# Altium footprint library PCB库.PcbLib: 46 footprints (part 3 of 3)
Each footprint in its own frame and in the unit in brackets; x right, y up, seen from the top. Pads: shape width x height; smd on the part's side, far side on the other; paste and mask are expansions set on the pad; w line width, h text height; cw(c..) or ccw(c..) is an arc to the next point about the centre after c.
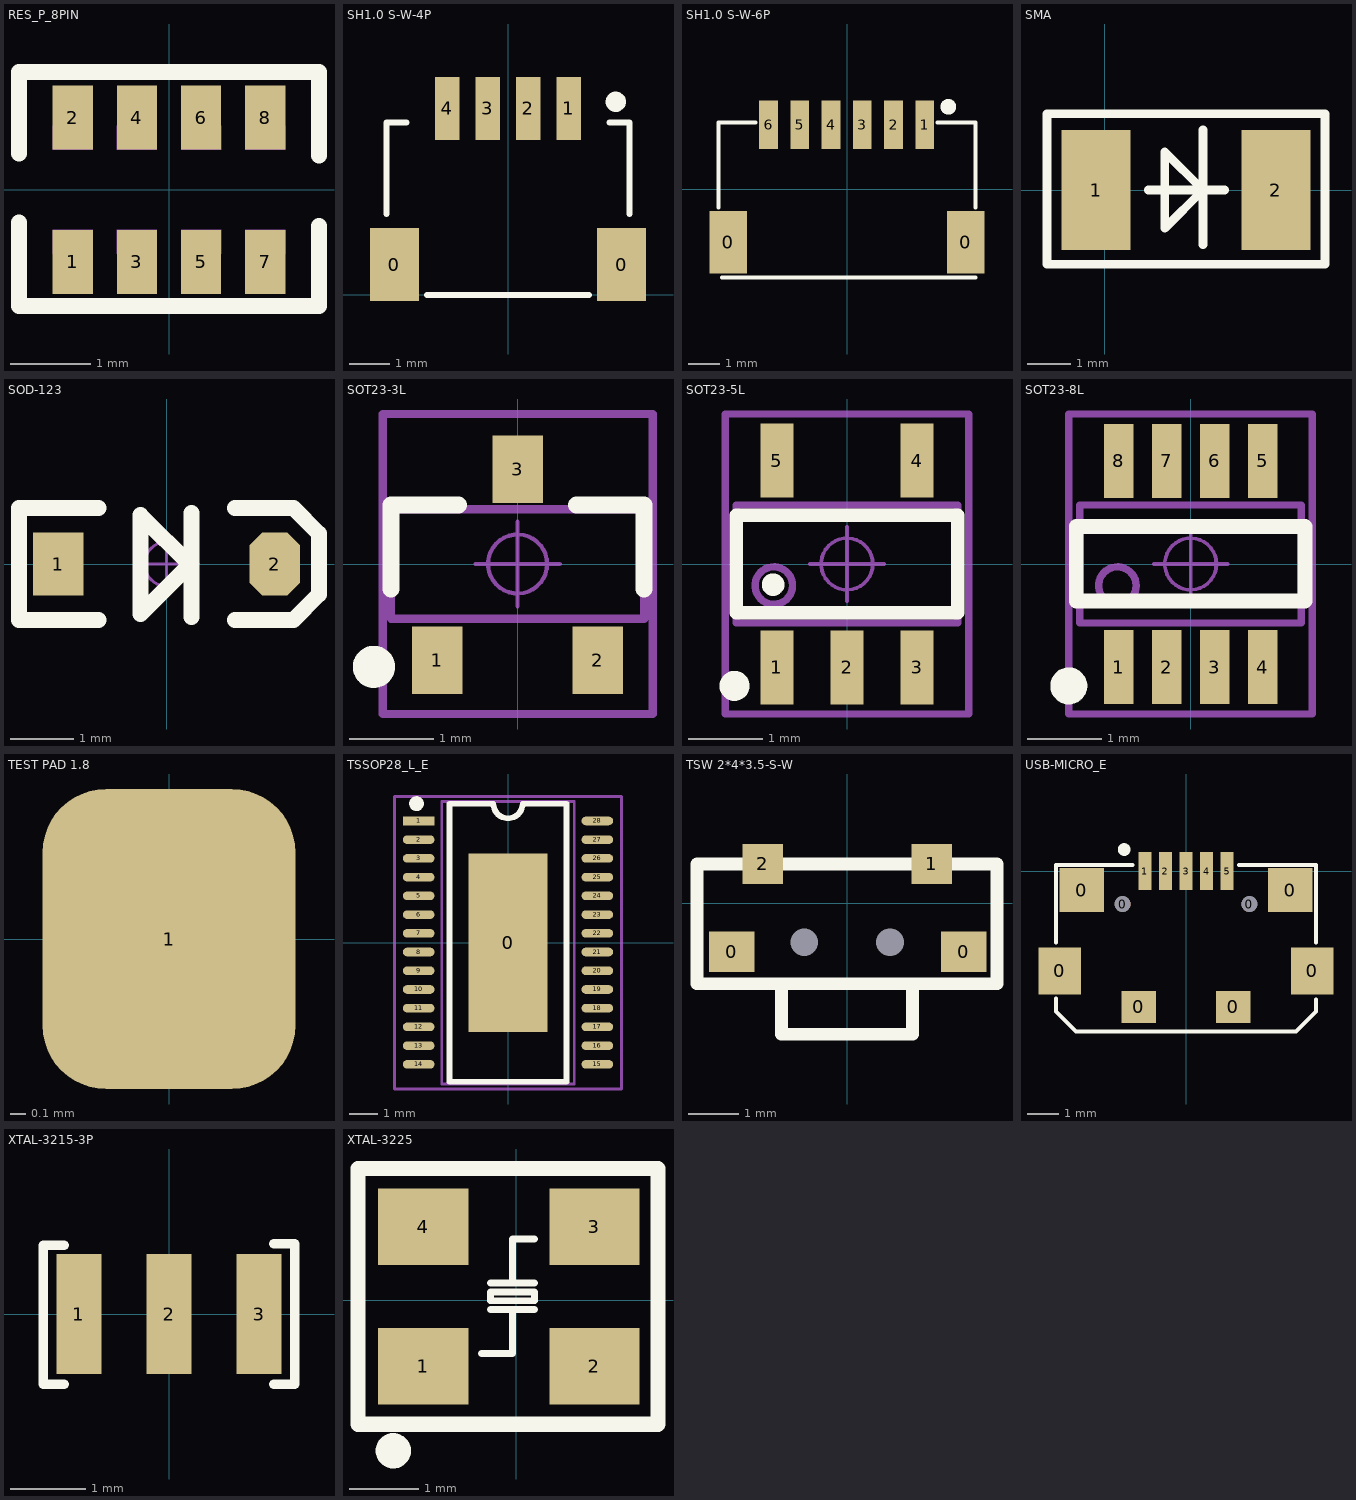
[diagram p2: the footprints below, top view; thin cyan lines are the x and y axes]

## RES_P_8PIN [mm]
pads (8):
  rect 0.5x0.8 smd: 1(-1.2,-0.9) 2(-1.2,0.9) 3(-0.4,-0.9) 4(-0.4,0.9) 5(0.4,-0.9) 6(0.4,0.9) 7(1.2,-0.9) 8(1.2,0.9)
Top Overlay:
  lines w0.2: -1.87,-0.41 -1.87,-1.45 1.87,-1.45 1.87,-0.45 ; -1.87,0.45 -1.87,1.47 1.87,1.47 1.87,0.43
Mechanical 15:
  region: -1.45,-0.8 -1.45,-0.5 -0.95,-0.5 -0.95,-0.8
  region: -1.45,0.5 -1.45,0.8 -0.95,0.8 -0.95,0.5
  region: -0.65,-0.8 -0.65,-0.5 -0.15,-0.5 -0.15,-0.8
  region: 0.15,-0.8 0.15,-0.5 0.65,-0.5 0.65,-0.8
  region: 0.15,0.5 0.15,0.8 0.65,0.8 0.65,0.5
  region: 0.95,-0.8 0.95,-0.5 1.45,-0.5 1.45,-0.8
  region: -0.65,0.5 -0.65,0.8 -0.15,0.8 -0.15,0.5
  region: 0.95,0.5 0.95,0.8 1.45,0.8 1.45,0.5

## SH1.0 S-W-4P [mm]
pads (6):
  rect 1.2x1.8 smd: 0(-2.8,0.75) 0(2.8,0.75)
  rect 0.6x1.55 smd: 1(1.5,4.6) 2(0.5,4.6) 3(-0.5,4.6) 4(-1.5,4.6)
Top Overlay:
  circle w0.25: c2.659,4.764 r0.125
  lines w0.15: -3,2 -3,4.25 -2.5,4.25 ; -2,0 2,0 ; 2.5,4.25 3,4.25 3,2
3D body "SM04B-SRSS-TB.STEP": height 2.92, standoff -0.04, extent -3,0 3,4.95

## SH1.0 S-W-6P [mm]
pads (8):
  rect 1.2x2 smd: 0(-3.8,-1.7) 0(3.8,-1.7)
  rect 0.6x1.55 smd: 1(2.489,2.057) 2(1.489,2.057) 3(0.489,2.057) 4(-0.511,2.057) 5(-1.511,2.057) 6(-2.511,2.057)
Top Overlay:
  circle w0.25: c3.243,2.63 r0.125
  lines w0.127: -4.115,-0.584 -4.115,2.134 -2.921,2.134 ; -3.994,-2.831 4.109,-2.831 ; 2.89,2.122 4.115,2.122 4.115,-0.596
3D body "User Library-JST - SM06B-SRSS-TB (SH SERIES - 1_0mm PITCH WIRE-TO-BOARD, SMT, RA).STEP": height 2.9, standoff 0, extent -3.988,-2.475 4.012,2.475

## SMA [mil] "DO-214AC(2010)"
pads (2):
  rect 63x110 smd: 1(-8,0) 2(157,0)
Top Overlay:
  lines w8: 40,0 110,0 ; 90,-50 90,55 ; -53,-68 202,-68 202,70 -53,70 -53,-68 ; 55,-35 90,0 55,35 55,-35
3D body "DO-214AC.STEP": height 94.49, standoff 0, extent -15.55,-53.3 165.55,53

## SOD-123 [mm]
pads (2):
  rect 0.8x1 smd: 1(-1.714,0)
  oct 0.8x1 smd: 2(1.714,0)
Top Overlay:
  lines w0.254: -1.079,-0.889 -2.337,-0.889 -2.337,0.889 -1.079,0.889 ; 0.356,-0.02 -0.417,-0.792 -0.417,0.775 0.396,-0.038 ; 0.396,-0.841 0.396,0.805 ; 1.079,-0.889 2.007,-0.889 2.413,-0.483 2.413,0.483 2.007,0.889 1.079,0.889
Mechanical 15:
  circle w0.05: c0,0 r0.35
  lines w0.05: -0.5,0 0.5,0 ; 0,-0.5 0,0.5
3D body "SOD-123.STEP": height 1.22, standoff 0, extent -1.85,-0.8 1.85,0.8

## SOT23-3L [mm]
pads (3):
  rect 0.6x0.8 smd: 1(-0.95,-1.143) 2(0.95,-1.143) 3(0,1.125)
Top Overlay:
  circle w0.25: c-1.702,-1.219 r0.125
  lines w0.2: -1.5,-0.3 -1.5,0.7 -0.7,0.7 ; 0.7,0.7 1.5,0.7 1.5,-0.3
Mechanical 13:
  lines w0.1: -1.5,-0.65 -1.5,0.65 1.5,0.65 1.5,-0.65 -1.5,-0.65
Mechanical 15:
  circle w0.05: c0,0 r0.35
  lines w0.05: -0.5,0 0.5,0 ; 0,-0.5 0,0.5
  lines w0.1: -1.6,-1.778 -1.6,1.778 1.6,1.778 1.6,-1.778 -1.6,-1.778
3D body "SOT23-3.STEP": height 1.05, standoff 0, extent -1.5,-1.2 1.5,1.2

## SOT23-5L [mm]
pads (5):
  rect 0.45x1 smd: 1(-0.95,-1.4) 2(0,-1.4) 3(0.95,-1.4) 4(0.95,1.4) 5(-0.95,1.4)
Top Overlay:
  circle w0.254: c-1.524,-1.651 r0.076
  circle w0.254: c-1.001,-0.279 r0.025
  lines w0.178: -1.5,-0.66 -1.5,0.66 1.5,0.66 1.5,-0.66 -1.5,-0.66
Mechanical 13:
  circle w0.1: c-0.992,-0.292 r0.254
  lines w0.1: -1.5,-0.8 1.5,-0.8 1.5,0.8 -1.5,0.8 -1.5,-0.8
Mechanical 15:
  circle w0.05: c0,0 r0.35
  lines w0.05: -0.5,0 0.5,0 ; 0,-0.5 0,0.5
  lines w0.1: -1.651,-2.032 1.651,-2.032 1.651,2.032 -1.651,2.032 -1.651,-2.032
3D body "SOT23-5.STEP": height 1.15, standoff -0.03, extent -1.5,-1.403 1.5,1.403

## SOT23-8L [mm]
pads (8):
  rect 0.4x1 smd: 1(-0.975,-1.397) 2(-0.325,-1.397) 3(0.325,-1.397) 4(0.975,-1.397) 5(0.975,1.397) 6(0.325,1.397) 7(-0.325,1.397) 8(-0.975,1.397)
Top Overlay:
  circle w0.25: c-1.65,-1.651 r0.125
  lines w0.2: -1.55,-0.5 1.55,-0.5 1.55,0.508 -1.55,0.508 -1.55,-0.5
Mechanical 13:
  circle w0.1: c-0.992,-0.292 r0.254
  lines w0.1: -1.5,-0.8 -1.5,0.8 1.5,0.8 1.5,-0.8 -1.5,-0.8
Mechanical 15:
  circle w0.05: c0,0 r0.35
  lines w0.05: -0.5,0 0.5,0 ; 0,-0.5 0,0.5
  lines w0.1: -1.65,-2.032 -1.65,2.032 1.65,2.032 1.65,-2.032 -1.65,-2.032
3D body "SOT23-8.STEP": height 1.15, standoff 0, extent -1.5,-1.403 1.5,1.403

## TEST PAD 1.8 [mm]
pads (1):
  rrect50% 1.6x1.9 smd: 1(0,0)

## TSSOP28_L_E [mm]
pads (29):
  rect 2.75x6.2 smd: 0(0,0)
  rect 1.1x0.3 smd: 1(-3.1,4.225)
  oval 1.1x0.3 smd: 2(-3.1,3.575) 3(-3.1,2.925) 4(-3.1,2.275) 5(-3.1,1.625) 6(-3.1,0.975) 7(-3.1,0.325) 8(-3.1,-0.325) 9(-3.1,-0.975) 10(-3.1,-1.625) 11(-3.1,-2.275) 12(-3.1,-2.925) 13(-3.1,-3.575) 14(-3.1,-4.225) 15(3.1,-4.225) 16(3.1,-3.575) 17(3.1,-2.925) 18(3.1,-2.275) 19(3.1,-1.625) 20(3.1,-0.975) 21(3.1,-0.325) 22(3.1,0.325) 23(3.1,0.975) 24(3.1,1.625) 25(3.1,2.275) 26(3.1,2.925) 27(3.1,3.575) 28(3.1,4.225)
Top Overlay:
  circle w0.254: c-3.175,4.826 r0.13
  lines w0.2: -2.032,-4.826 -2.032,4.826 -0.508,4.826 ccw(c0,4.826) 0.508,4.826 2.032,4.826 2.032,-4.826 -2.032,-4.826
Mechanical 13:
  lines w0.1: -2.3,-4.9 2.3,-4.9 2.3,4.9 -2.3,4.9 -2.3,-4.9
Mechanical 15:
  circle w0.05: c0,0 r0.35
  lines w0.05: -0.5,0 0.5,0 ; 0,-0.5 0,0.5
  lines w0.1: -3.937,-5.08 3.937,-5.08 3.937,5.08 -3.937,5.08 -3.937,-5.08
3D body "TSSOP28.STEP": height 1.03, standoff -0.02, extent -3.202,-4.9 3.202,4.9

## TSW 2*4*3.5-S-W [mm]
pads (6):
  rect 0.9x0.8 smd: 0(-2.289,-0.965) 0(2.311,-0.965)
  round 0 hole 0.55 unplated: 0(-0.85,-0.775) 0(0.85,-0.775)
  rect 0.8x0.8 smd: 1(1.676,0.775) 2(-1.674,0.775)
Top Overlay:
  lines w0.254: -1.3,-1.6 -1.3,-2.6 1.3,-2.6 1.3,-1.6 ; -2.975,-1.6 2.972,-1.6 2.972,0.775 -2.975,0.775 -2.975,-1.6

## USB-MICRO_E [mm]
pads (13):
  rect 1.35x1.5 smd: 0(-4,-3.16) 0(4,-3.16)
  rect 1.4x1.4 smd: 0(-3.3,-0.6) 0(3.3,-0.6)
  round 0.5 hole 0.5 paste+0 mask+0: 0(-2.007,-1.041) 0(2.007,-1.041)
  rect 1.1x1 smd: 0(-1.5,-4.3) 0(1.5,-4.3)
  rect 0.4x1.2 smd: 1(-1.3,0) 2(-0.65,0) 3(0,0) 4(0.65,0) 5(1.3,0)
Top Overlay:
  circle w0.2: c-1.957,0.686 r0.1
  lines w0.127: -4.115,-4.039 -4.115,-4.445 -3.48,-5.08 3.48,-5.08 4.115,-4.445 4.115,-4.064 ; -4.115,-2.261 -4.115,0.203 -1.702,0.203 ; 1.676,0.203 4.115,0.203 4.115,-2.261
3D body "2174507-2.stp": height 2.83, standoff 0.13, extent -3.9,-4.724 3.9,0.276

## XTAL-3215-3P [mm]
pads (3):
  rect 0.6x1.6 smd: 1(-1.2,0) 2(0,0) 3(1.2,0)
Top Overlay:
  lines w0.127: -1.397,-0.94 -1.676,-0.94 -1.676,0.914 -1.397,0.914 ; 1.397,-0.94 1.676,-0.94 1.676,0.94 1.397,0.94
3D body "User Library-NDK_NX3215SA.STEP": height 0.9, standoff 0.1, extent -1.6,-0.737 1.6,0.763

## XTAL-3225 [mm]
pads (4):
  rect 1.3x1.1 smd: 1(-1.338,-0.951) 2(1.126,-0.951) 3(1.126,1.056) 4(-1.338,1.056)
Top Overlay:
  circle w0.254: c-1.77,-2.17 r0.127
  lines w0.1: -0.5,-0.773 -0.055,-0.773 -0.055,-0.138 ; -0.373,-0.138 0.262,-0.138 ; -0.373,0.243 0.262,0.243 ; -0.055,0.243 -0.055,0.878 0.262,0.878 ; -0.373,-0.011 0.262,-0.011 0.262,0.116 -0.373,0.116 -0.373,-0.011
  lines w0.22: -2.278,-1.789 -2.278,1.894 2.04,1.894 2.04,-1.789 -2.278,-1.789
3D body "XTAL-3225.STEP": height 0.8, standoff 0, extent -1.719,-1.236 1.481,1.264